# Altium footprint library LUCHADOR PCBLIB.PcbLib: 75 footprints (part 5 of 5)
Each footprint in its own frame and in the unit in brackets; x right, y up, seen from the top. Pads: shape width x height; smd on the part's side, far side on the other; paste and mask are expansions set on the pad; w line width, h text height; cw(c..) or ccw(c..) is an arc to the next point about the centre after c.
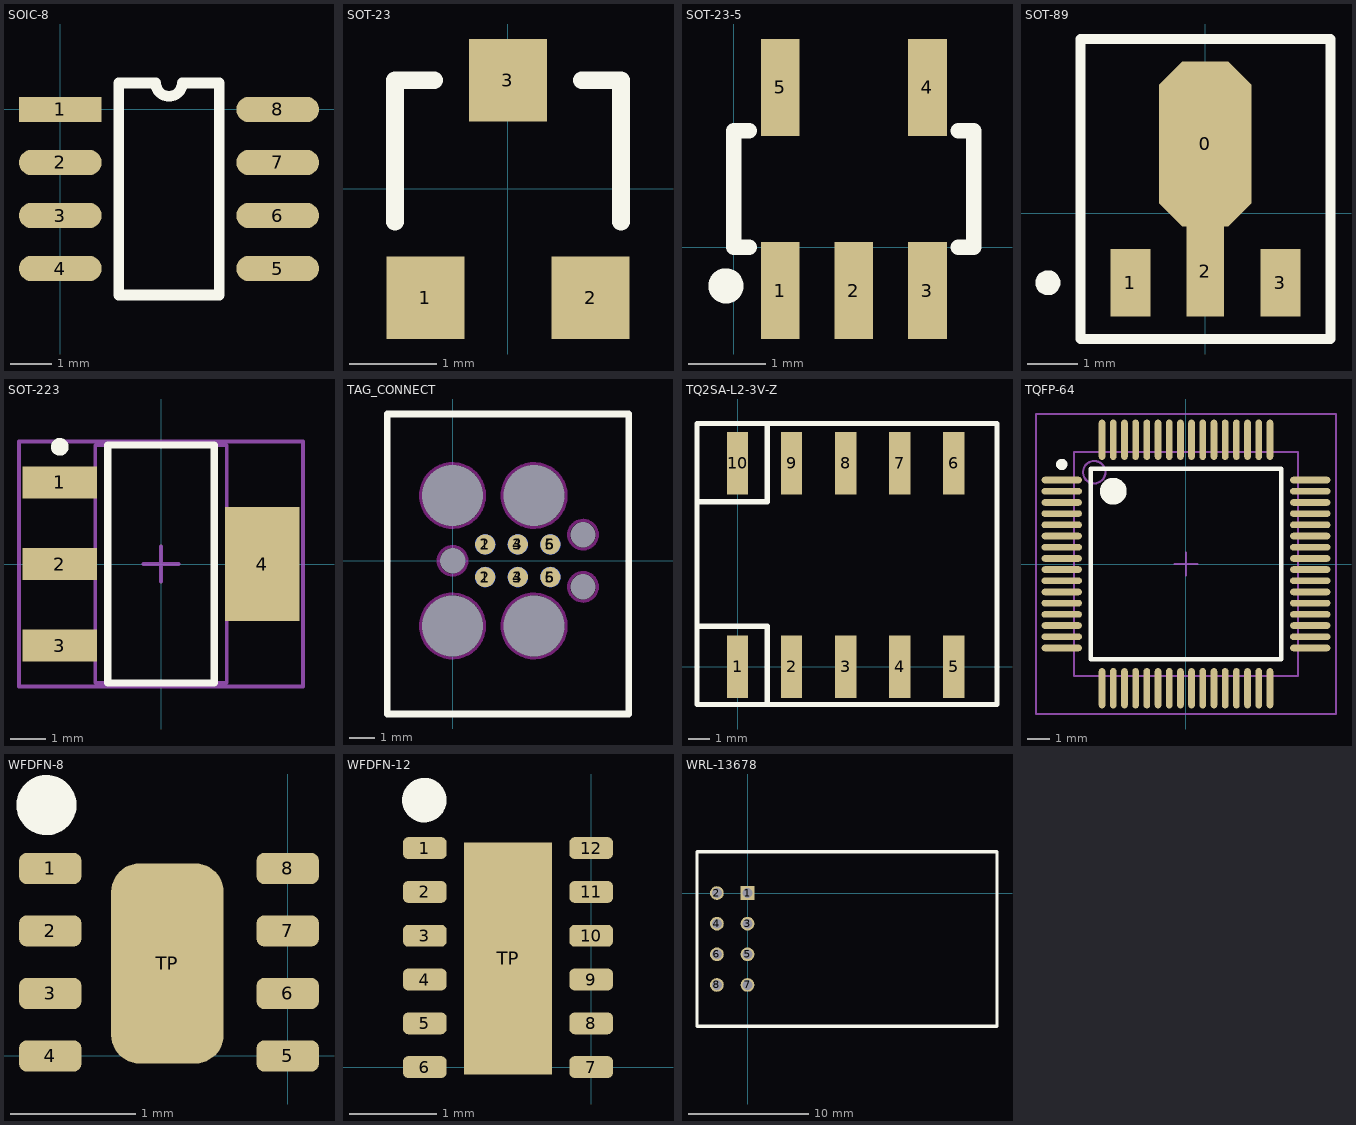
[diagram p4: the footprints below, top view; thin cyan lines are the x and y axes]

## SOIC-8 [mil]
height 175
pads (8):
  rect 78x24 smd: 1(0,0)
  oval 78x24 smd: 2(0,-50) 3(0,-100) 4(0,-150) 5(205,-150) 6(205,-100) 7(205,-50) 8(205,0)
Top Overlay:
  lines w10: 55,-175 55,25 90,25 ccw(c102.5,25) 115,25 150,25 150,-175 55,-175
3D body "User Library-SOIC-8.STEP": height 68.9, standoff 0.01, extent -13.33,-173 223.34,23.85

## SOT-23 [mm] "SOT-23; 3 Leads; Body 3.0 x 2.6 mm, inc. leads (LxW max)"
height 1.1
pads (3):
  rect 0.9x0.95 smd: 1(-0.95,-1.25) 2(0.95,-1.25) 3(0,1.25)
Top Overlay:
  lines w0.203: -1.3,-0.375 -1.3,1.25 -0.85,1.25 ; 0.85,1.25 1.3,1.25 1.3,-0.375
3D body "User Library-sot-3p290x130ll237h100.step": height 0.97, standoff -0.04, extent -1.427,-1.16 1.473,1.21

## SOT-23-5 [mm] "5-Lead Plastic SOT-23"
height 1
pads (5):
  rect 0.5x1.25 smd: 1(0.6,-0.56) 2(1.55,-0.56) 3(2.5,-0.56) 4(2.5,2.06) 5(0.6,2.06)
Top Overlay:
  circle w0.254: c-0.1,-0.5 r0.1
  lines w0.2: 0.2,0 0,0 0,1.5 0.2,1.5 ; 2.9,0 3.1,0 3.1,1.5 2.9,1.5
3D body "User Library-SOT23-5-1.STEP": height 1.32, standoff 0.02, extent 0.049,-0.763 3.05,2.237

## SOT-89 [mm] "SOT-89; Body 4.6 x 4.25 mm, inc. leads (LxW max)"
height 1.6
pads (4):
  oct 1.85x3.3 smd: 0(0,1.388)
  rect 0.8x1.35 smd: 1(-1.5,-1.387) 3(1.5,-1.387)
  rect 0.75x1.8 smd: 2(0,-1.162)
Top Overlay:
  circle w0.25: c-3.15,-1.387 r0.125
  lines w0.2: -2.5,-2.512 -2.5,3.487 2.5,3.487 2.5,-2.512 -2.5,-2.512

## SOT-223 [mm] "SOT223, 4-Leads, Body 6.5x3.5mm, Pitch 2.3mm, Lead Span 7mm, IPC High Density"
height 1.7
pads (4):
  rect 2.1x0.9 smd: 1(-2.85,2.3) 2(-2.85,0) 3(-2.85,-2.3)
  rect 2.1x3.2 smd: 4(2.85,0)
Top Overlay:
  circle w0.25: c-2.85,3.3 r0.125
  lines w0.2: -1.5,-3.35 -1.5,3.35 1.5,3.35 1.5,-3.35 -1.5,-3.35
Mechanical 13:
  lines w0.1: -1.85,-3.35 -1.85,3.35 1.85,3.35 1.85,-3.35 -1.85,-3.35
Mechanical 15:
  lines w0.1: -0.5,0 0.5,0 ; 0,-0.5 0,0.5 ; -4,-3.45 -4,3.45 4,3.45 4,-3.45 -4,-3.45
3D body "SW3DPS-SOT-223-DEFAULT.step": height 1.7, standoff 0.02, extent -3.607,-3.277 3.353,3.223

## TAG_CONNECT [mil]
pads (19):
  round 31 smd paste-20: 1(50,-25) 2(50,25) 3(100,-25) 4(100,25) 5(150,-25) 6(150,25)
  round 31 smd far side paste-20: 1(50,25) 2(50,-25) 3(100,25) 4(100,-25) 5(150,25) 6(150,-25)
  rect 0x0 hole 93.5 unplated: M(0,-100) M(0,100) M(125,-100) M(125,100)
  rect 0x0 hole 39 unplated: M(0,0) M(200,-40) M(200,40)
Top Overlay:
  lines w10: -100,-235 -100,225 270,225 270,-235 -100,-235
Keep-Out Layer:
  circle w5: c0,100 r49.01
  circle w5: c125,100 r49
  circle w5: c200,40 r22
  circle w5: c200,-40 r22
  circle w5: c125,-100 r49
  circle w5: c0,-100 r49
  circle w5: c0,0 r22.02

## TQ2SA-L2-3V-Z [mm]
pads (10):
  rect 1x2.94 smd: 1(0,0) 2(2.54,0) 3(5.08,0) 4(7.62,0) 5(10.16,0) 6(10.16,9.55) 7(7.62,9.55) 8(5.08,9.55) 9(2.54,9.55) 10(0,9.55)
Top Overlay:
  lines w0.254: -1.905,1.905 1.397,1.905 1.397,-1.778 ; -1.905,7.747 1.397,7.747 1.397,11.43 ; -1.905,-1.778 -1.905,11.43 12.192,11.43 12.192,-1.778 -1.905,-1.778
3D body "TQ2SA-L2-3V-Z.STEP": height 5.71, standoff 0.01, extent -1.91,-1.003 12.09,10.503

## TQFP-64 [mm] "Thin QFP, 64-Leads, Body 10x10mm, Pitch 0.5mm, IPC Medium Density"
height 1.2
pads (64):
  oval 1.8x0.3 smd: 1(-5.55,3.75) 2(-5.55,3.25) 3(-5.55,2.75) 4(-5.55,2.25) 5(-5.55,1.75) 6(-5.55,1.25) 7(-5.55,0.75) 8(-5.55,0.25) 9(-5.55,-0.25) 10(-5.55,-0.75) 11(-5.55,-1.25) 12(-5.55,-1.75) 13(-5.55,-2.25) 14(-5.55,-2.75) 15(-5.55,-3.25) 16(-5.55,-3.75) 33(5.55,-3.75) 34(5.55,-3.25) 35(5.55,-2.75) 36(5.55,-2.25) 37(5.55,-1.75) 38(5.55,-1.25) 39(5.55,-0.75) 40(5.55,-0.25) 41(5.55,0.25) 42(5.55,0.75) 43(5.55,1.25) 44(5.55,1.75) 45(5.55,2.25) 46(5.55,2.75) 47(5.55,3.25) 48(5.55,3.75)
  oval 0.3x1.8 smd: 17(-3.75,-5.55) 18(-3.25,-5.55) 19(-2.75,-5.55) 20(-2.25,-5.55) 21(-1.75,-5.55) 22(-1.25,-5.55) 23(-0.75,-5.55) 24(-0.25,-5.55) 25(0.25,-5.55) 26(0.75,-5.55) 27(1.25,-5.55) 28(1.75,-5.55) 29(2.25,-5.55) 30(2.75,-5.55) 31(3.25,-5.55) 32(3.75,-5.55) 49(3.75,5.55) 50(3.25,5.55) 51(2.75,5.55) 52(2.25,5.55) 53(1.75,5.55) 54(1.25,5.55) 55(0.75,5.55) 56(0.25,5.55) 57(-0.25,5.55) 58(-0.75,5.55) 59(-1.25,5.55) 60(-1.75,5.55) 61(-2.25,5.55) 62(-2.75,5.55) 63(-3.25,5.55) 64(-3.75,5.55)
Top Overlay:
  circle w0.6: c-3.25,3.25 r0.3
  circle w0.25: c-5.55,4.45 r0.125
  lines w0.2: -4.25,-4.25 4.25,-4.25 4.25,4.25 -4.25,4.25 -4.25,-4.25
Mechanical 13:
  circle w0.1: c-4.1,4.1 r0.5
  lines w0.1: -5,-5 5,-5 5,5 -5,5 -5,-5
Mechanical 15:
  lines w0.1: -0.5,0 0.5,0 ; 0,-0.5 0,0.5 ; -6.7,-6.7 6.7,-6.7 6.7,6.7 -6.7,6.7 -6.7,-6.7
3D body "User Library-TQFP64_Grid_0_5.STEP": height 1.06, standoff -0.14, extent -5.994,-6.006 6.006,5.994

## WFDFN-8 [mm]
pads (9):
  rrect50% 0.5x0.25 smd: 1(-1.9,1.5) 2(-1.9,1) 3(-1.9,0.5) 4(-1.9,0) 5(0,0) 6(0,0.5) 7(0,1) 8(0,1.5)
  rrect50% 0.9x1.6 smd: TP(-0.963,0.739)
Top Overlay:
  circle w0.254: c-1.93,2.007 r0.114
3D body "WFDN8.STEP": height 0.81, standoff 0, extent -2.024,-0.303 0.076,1.797

## WFDFN-12 [mm]
pads (13):
  rrect50% 0.5x0.25 smd: 1(-1.9,2.5) 2(-1.9,2) 3(-1.9,1.5) 4(-1.9,1) 5(-1.9,0.5) 6(-1.9,0) 7(0,0) 8(0,0.5) 9(0,1) 10(0,1.5) 11(0,2) 12(0,2.5)
  rect 1x2.65 smd: TP(-0.95,1.242)
Top Overlay:
  circle w0.254: c-1.905,3.048 r0.127
3D body "WFDFN12.STEP": height 0.82, standoff 0.01, extent -2.009,-0.303 0.091,2.797

## WRL-13678 [mil]
pads (8):
  rect 45x45 hole 32: 1(0,0)
  round 45 hole 32: 2(-100,0) 3(0,-100) 4(-100,-100) 5(0,-200) 6(-100,-200) 7(0,-300) 8(-100,-300)
Top Overlay:
  lines w10: -165,-435 -165,135 815,135 815,-435 -165,-435
3D body "901512108.stp": height 335.13, standoff -113.69, extent -149.99,-350 50.01,50
3D body "User Library-Wi07C.STEP": height 581.4, standoff 121.65, extent -163.19,-436 813.19,134.87